# Altium footprint library 1MaxPcb.PcbLib: 187 footprints (part 3 of 12)
Each footprint in its own frame and in the unit in brackets; x right, y up, seen from the top. Pads: shape width x height; smd on the part's side, far side on the other; paste and mask are expansions set on the pad; w line width, h text height; cw(c..) or ccw(c..) is an arc to the next point about the centre after c.
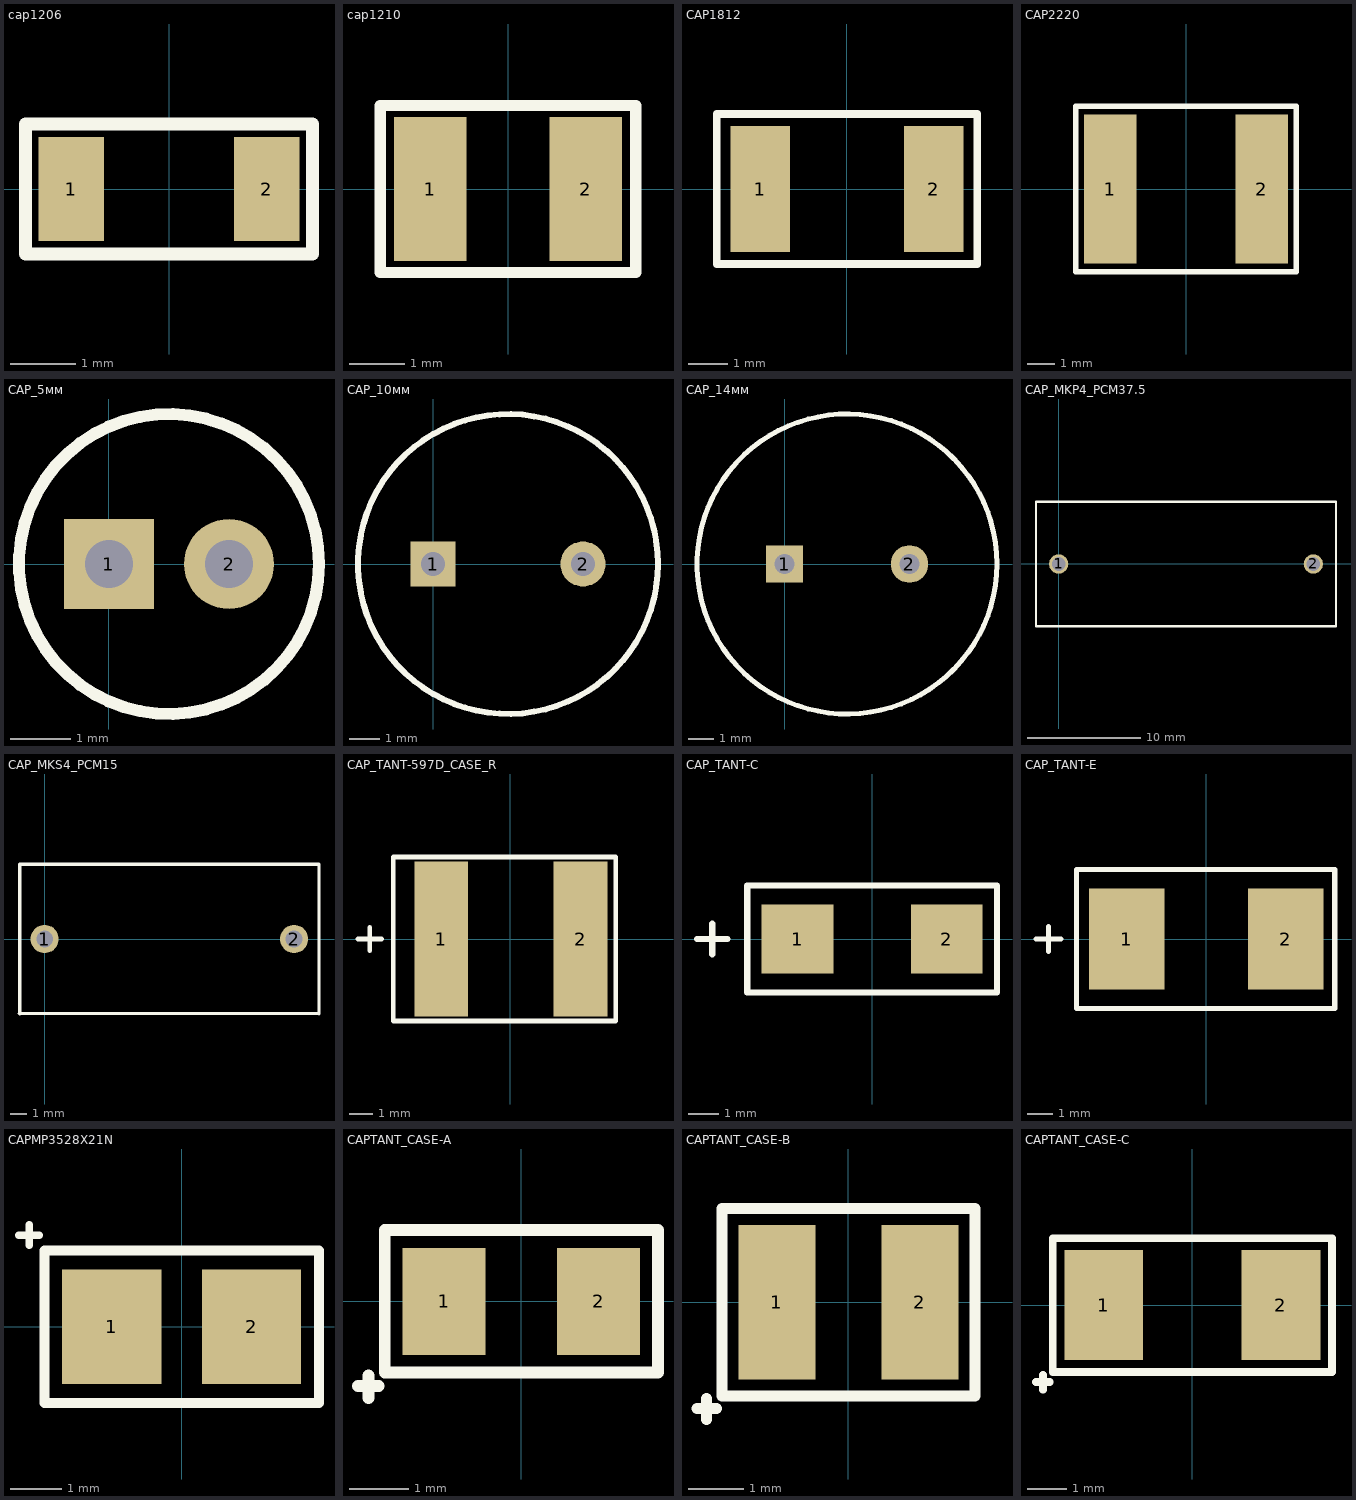
[diagram p2: the footprints below, top view; thin cyan lines are the x and y axes]

## cap1206 [mm]
height 0.55
pads (2):
  rect 1x1.6 smd mask+0.03: 1(-1.5,0) 2(1.5,0)
Top Overlay:
  lines w0.2: -2.2,-1 2.2,-1 2.2,1 -2.2,1 -2.2,-1
3D body "cap1206.STEP": height 0.79, standoff 0.01, extent -1.6,-0.8 1.6,0.8

## cap1210 [mm]
height 0.55
pads (2):
  rect 1.3x2.6 smd mask+0.05: 1(-1.4,0) 2(1.4,0)
Top Overlay:
  lines w0.2: -2.3,-1.5 2.3,-1.5 2.3,1.5 -2.3,1.5 -2.3,-1.5
3D body "cap1210.STEP": height 0.79, standoff 0.01, extent -1.5,-1.25 1.7,1.25

## CAP1812 [mm]
pads (2):
  rect 1.5x3.2 smd: 1(-2.2,0) 2(2.2,0)
Top Overlay:
  lines w0.2: -3.3,-1.9 3.3,-1.9 3.3,1.9 -3.3,1.9 -3.3,-1.9
3D body "CAPC1812.STEP": height 0.98, standoff -0.02, extent -2.25,-1.6 2.25,1.6

## CAP2220 [mm] "Chip Monolithic Ceramic Capacitors general application 2220"
pads (2):
  rect 1.9x5.4 smd: 1(-2.75,0) 2(2.75,0)
Top Overlay:
  lines w0.2: -4,-3 -4,3 4,3 4,-3 -4,-3
3D body "User Library-CAPC5750X23.STEP": height 2.3, standoff 0, extent -2.85,-2.5 2.85,2.5

## CAP_5мм [mm]
pads (2):
  rect 1.5x1.5 hole 0.8: 1(0,0)
  round 1.5 hole 0.8: 2(2,0)
Top Overlay:
  circle w0.2: c1,0 r2.5
3D body "CAP-ALU-H11.2D5.0P2.0LD0.5 vert.stp": height 11.22, standoff -3.1, extent -1.49,-2.466 3.49,2.514

## CAP_10мм [mm]
pads (2):
  rect 1.5x1.5 hole 0.8: 1(0,0)
  round 1.5 hole 0.8: 2(5,0)
Top Overlay:
  circle w0.2: c2.5,0 r5
3D body "ELCO-D8P3.5H11.5LD0.6.stp": height 11.5, standoff -3, extent -1.5,-4 6.5,4

## CAP_14мм [mm]
pads (2):
  rect 1.5x1.5 hole 0.8: 1(0,0)
  round 1.5 hole 0.8: 2(5,0)
Top Overlay:
  circle w0.2: c2.5,0 r6
3D body "CAPTH1000-50.stp": height 3.23, standoff -20.82, extent -3.852,-6.35 8.85,6.35

## CAP_MKP4_PCM37.5 [mm] "FILM CAP WIMA"
pads (2):
  round 1.7 hole 1.2: 1(0,0) 2(22.5,0)
Top Overlay:
  lines w0.2: -2,-5.5 24.5,-5.5 24.5,5.5 -2,5.5 -2,-5.5
3D body "User Library-WIMA Capacitor (2).step": height 21, standoff -2.5, extent -1.965,-5.5 24.535,5.5

## CAP_MKS4_PCM15 [mm] "MKS4B051004J00K"
pads (2):
  round 1.7 hole 1: 1(0,0) 2(15,0)
Top Overlay:
  lines w0.2: -1.537,-4.475 16.463,-4.475 ; -1.5,-4.5 -1.5,4.5 16.5,4.5 16.5,-4.5
3D body "MKS4B051004J00K_WIMA.stp": height 19, standoff -0.5, extent -1.5,-4.5 16.5,4.5

## CAP_TANT-597D_CASE_R [mm]
pads (2):
  rect 2.3x6.6 smd: 1(-2.95,0) 2(3,0)
Top Overlay:
  lines w0.2: -6.5,0 -5.5,0 ; -6,-0.5 -6,0.5 ; -5,-3.5 4.5,-3.5 4.5,3.5 -5,3.5 -5,-3.5
3D body "597D.STEP": height 4, standoff 0, extent -3.9,-2.2 3.7,2.2

## CAP_TANT-C [mm]
pads (2):
  rect 2.35x2.25 smd: 1(-2.45,0) 2(2.45,0)
Top Overlay:
  lines w0.2: -5.75,0 -4.75,0 ; -5.25,-0.5 -5.25,0.5 ; -4.1,-1.75 -4.1,1.75 -3.05,1.75 3.25,1.75 4.1,1.75 4.1,-1.75 3.25,-1.75 -3.075,-1.75 -4.1,-1.75
3D body "CAP_TANT C_CASEy.step": height 2.8, standoff 0, extent -3.075,-1.75 3.225,1.75

## CAP_TANT-E [mm]
pads (2):
  rect 3x4 smd: 1(-3.15,0) 2(3.15,0)
Top Overlay:
  lines w0.2: -6.75,0 -5.75,0 ; -6.25,-0.5 -6.25,0.5 ; -5.15,-2.75 -5.15,2.75 5.1,2.75 5.1,-2.75 -5.15,-2.75
3D body "User Library-AVX_E_CASE.STEP": height 4.2, standoff 0, extent -3.65,-2.225 3.75,2.225

## CAPMP3528X21N [mm] "Molded Capacitor, 2-Leads, Body 3,50x2,80mm, IPC Medium Density"
height 2.1
pads (2):
  rect 1.95x2.25 smd: 1(-1.375,0) 2(1.375,0)
Top Overlay:
  lines w0.15: -3.2,1.8 -2.8,1.8 ; -3,1.6 -3,2
  lines w0.2: -2.7,-1.5 -2.7,1.5 0,1.5 2.7,1.5 2.7,-1.5 -2.7,-1.5
3D body "User Library-CaseB_3528-21.step": height 1.9, standoff 0, extent -1.75,-1.4 1.75,1.4

## CAPTANT_CASE-A [mm] "\"J\" вывод 3216 (1206)"
pads (2):
  rect 1.4x1.8 smd: 1(-1.3,0) 2(1.3,0)
Top Overlay:
  lines w0.2: -2.75,-1.425 -2.4,-1.425 ; -2.575,-1.625 -2.575,-1.25 ; -2.3,-1.2 -2.3,1.2 2.3,1.2 2.3,-1.2 -2.3,-1.2
3D body "User Library-CaseA_3216-18.STEP": height 1.6, standoff 0, extent -1.6,-0.8 1.6,0.8

## CAPTANT_CASE-B [mm] "\"J\" вывод 3528 (1210)"
pads (2):
  rect 1.4x2.8 smd: 1(-1.3,0) 2(1.3,0)
Top Overlay:
  lines w0.2: -2.75,-1.925 -2.4,-1.925 ; -2.575,-2.125 -2.575,-1.75 ; -2.3,-1.7 -2.3,1.7 2.3,1.7 2.3,-1.7 -2.3,-1.7
3D body "User Library-CaseB_3528-21.STEP": height 1.9, standoff 0, extent -1.75,-1.4 1.75,1.4

## CAPTANT_CASE-C [mm] "\"J\" вывод 6032 (2312)"
pads (2):
  rect 2x2.8 smd: 1(-2.25,0) 2(2.25,0)
Top Overlay:
  lines w0.2: -3.975,-1.95 -3.625,-1.95 ; -3.8,-2.15 -3.8,-1.775 ; -3.55,-1.7 -3.55,1.7 3.55,1.7 3.55,-1.7 -3.55,-1.7
3D body "User Library-CaseC_6032-28.STEP": height 2.5, standoff 0, extent -2.95,-1.6 3.05,1.6